# Altium footprint library tianxiaohua_PcbLib.PcbLib: 138 footprints (part 6 of 9)
Each footprint in its own frame and in the unit in brackets; x right, y up, seen from the top. Pads: shape width x height; smd on the part's side, far side on the other; paste and mask are expansions set on the pad; w line width, h text height; cw(c..) or ccw(c..) is an arc to the next point about the centre after c.
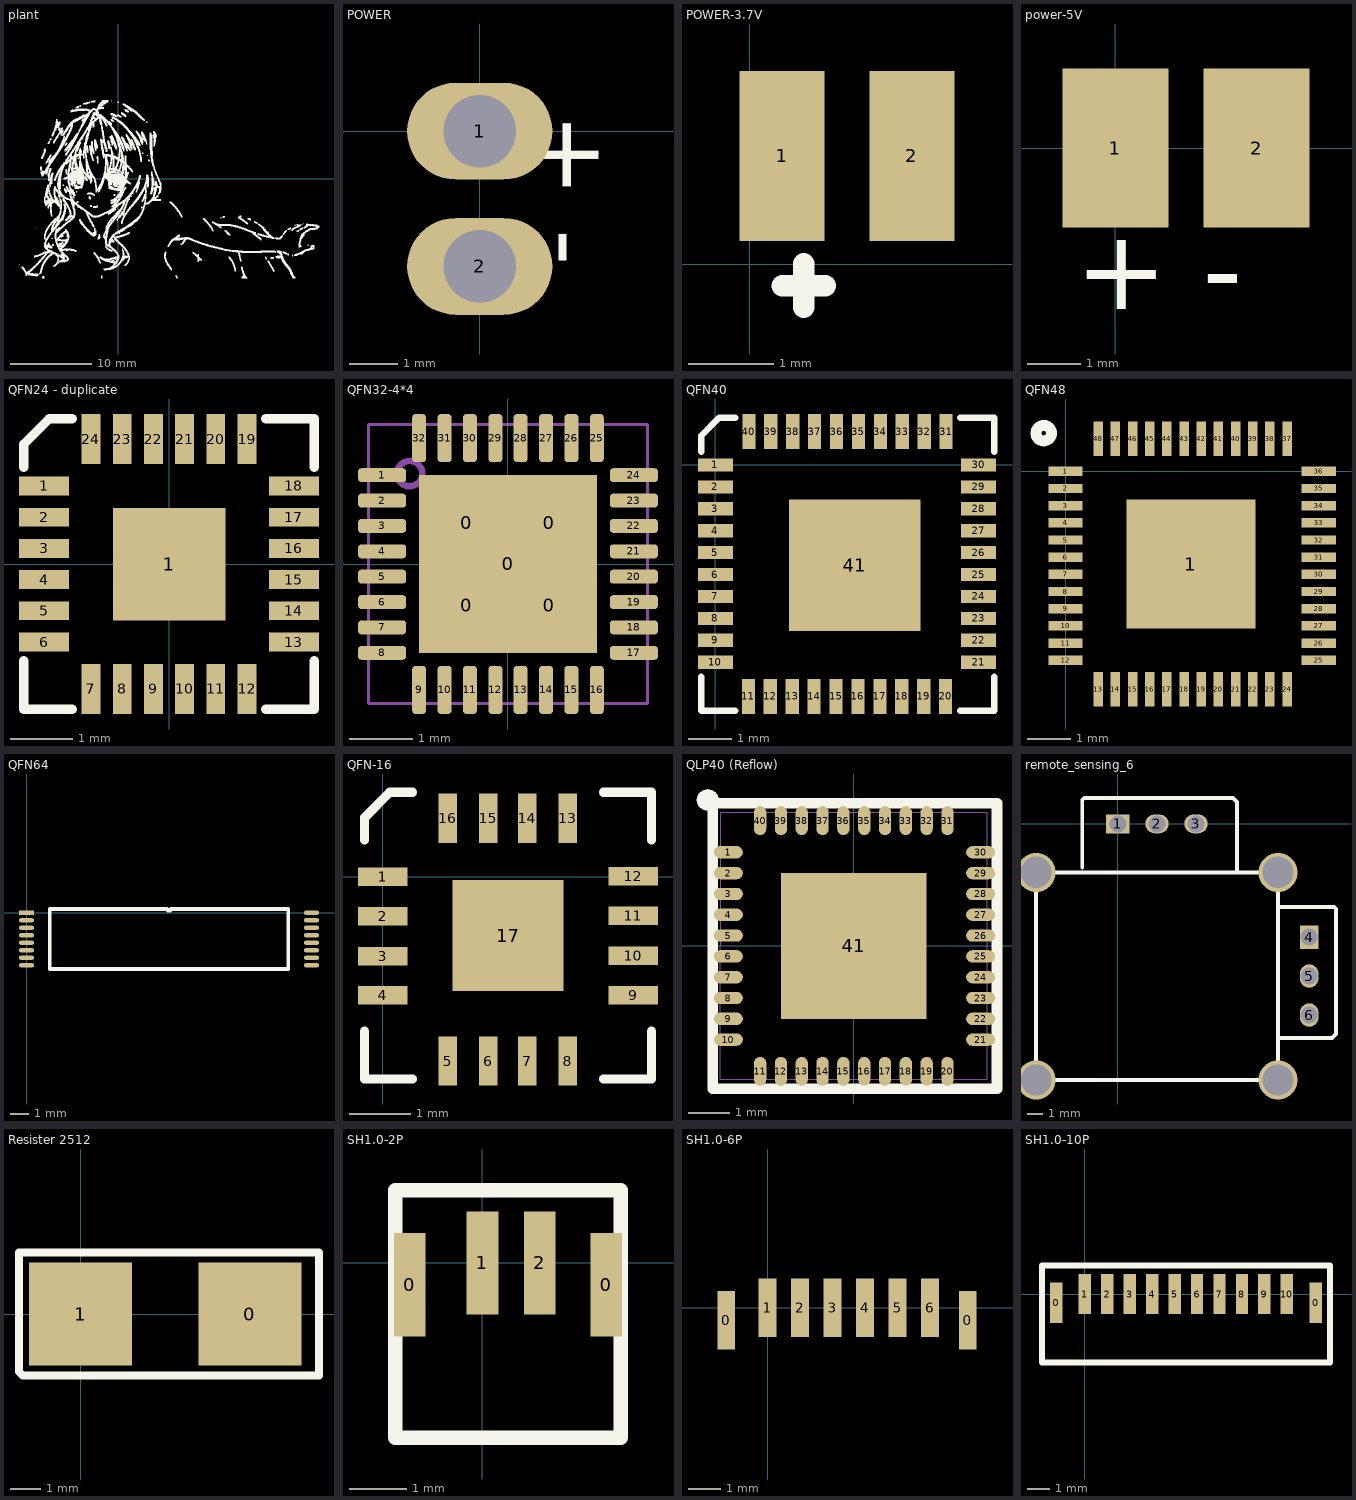
[diagram p5: the footprints below, top view; thin cyan lines are the x and y axes]

## plant [mm] "美少女"
Top Overlay:
  drawing of 12183 lines, arcs and shapes, not listed

## POWER [mm]
pads (2):
  oval 3x2 hole 1.5: 1(0,0) 2(0,-2.794)
Top Overlay:
  text "+ -" at 1.143,0.381 h1.52

## POWER-3.7V [mm]
pads (2):
  rect 1x2 smd: 1(0.381,1.27) 2(1.905,1.27)
Top Overlay:
  lines w0.254: 0.381,-0.254 0.889,-0.254 ; 0.635,-0.508 0.635,0

## power-5V [mm]
pads (2):
  rect 2x3 smd: 1(0,0) 2(2.667,0)
Top Overlay:
  text "+ -" at -0.762,-3.048 h1.52

## QFN24 - duplicate [mm]
pads (25):
  rect 0.8x0.3 smd: 1(-2,1.25) 2(-2,0.75) 3(-2,0.25) 4(-2,-0.25) 5(-2,-0.75) 6(-2,-1.25) 13(2,-1.25) 14(2,-0.75) 15(2,-0.25) 16(2,0.25) 17(2,0.75) 18(2,1.25)
  rect 1.8x1.8 smd: 1(0.005,0)
  rect 0.3x0.8 smd: 7(-1.25,-2) 8(-0.75,-2) 9(-0.25,-2) 10(0.25,-2) 11(0.75,-2) 12(1.25,-2) 19(1.25,2) 20(0.75,2) 21(0.25,2) 22(-0.25,2) 23(-0.75,2) 24(-1.25,2)
Top Overlay:
  lines w0.15: -2.325,-1.55 -2.325,-2.325 -1.55,-2.325 ; -2.325,1.55 -2.325,1.917 -1.917,2.325 -1.55,2.325 ; 1.55,-2.325 2.325,-2.325 2.325,-1.55 ; 1.55,2.325 2.325,2.325 2.325,1.55
3D body "QFN24.step": height 0.9, standoff 0, extent -1.997,-2.002 2.007,2.002

## QFN32-4*4 [mm]
pads (37):
  rrect50% 1.1x1.1 on Top Paste: 0(-0.65,-0.65) 0(-0.65,0.65) 0(0.65,-0.65) 0(0.65,0.65)
  rect 2.8x2.8 smd paste-10: 0(0,0)
  rrect50% 0.76x0.22 smd: 1(-1.985,1.4) 2(-1.985,1) 3(-1.985,0.6) 4(-1.985,0.2) 5(-1.985,-0.2) 6(-1.985,-0.6) 7(-1.985,-1) 8(-1.985,-1.4) 17(1.985,-1.4) 18(1.985,-1) 19(1.985,-0.6) 20(1.985,-0.2) 21(1.985,0.2) 22(1.985,0.6) 23(1.985,1) 24(1.985,1.4)
  rrect50% 0.22x0.76 smd: 9(-1.4,-1.985) 10(-1,-1.985) 11(-0.6,-1.985) 12(-0.2,-1.985) 13(0.2,-1.985) 14(0.6,-1.985) 15(1,-1.985) 16(1.4,-1.985) 25(1.4,1.985) 26(1,1.985) 27(0.6,1.985) 28(0.2,1.985) 29(-0.2,1.985) 30(-0.6,1.985) 31(-1,1.985) 32(-1.4,1.985)
Mechanical 11:
  circle w0.1: c-1.55,1.425 r0.2
Mechanical 15:
  lines w0.05: -0.5,0 0.5,0 ; 0,-0.5 0,0.5 ; -2.2,-2.2 2.2,-2.2 2.2,2.2 -2.2,2.2 -2.2,-2.2
3D body: height 0.55, standoff 0.05, extent -2,-2 2,2
3D body: height 0.56, standoff 0, extent -1.749,1.226 -1.35,1.625

## QFN40 [mm]
pads (41):
  rect 0.8x0.3 smd: 1(0,0) 2(0,-0.5) 3(0,-1) 4(0,-1.5) 5(0,-2) 6(0,-2.5) 7(0,-3) 8(0,-3.5) 9(0,-4) 10(0,-4.5) 21(6,-4.5) 22(6,-4) 23(6,-3.5) 24(6,-3) 25(6,-2.5) 26(6,-2) 27(6,-1.5) 28(6,-1) 29(6,-0.5) 30(6,0)
  rect 0.3x0.8 smd: 11(0.75,-5.282) 12(1.25,-5.282) 13(1.75,-5.282) 14(2.25,-5.282) 15(2.75,-5.282) 16(3.25,-5.282) 17(3.75,-5.282) 18(4.25,-5.282) 19(4.75,-5.282) 20(5.25,-5.282) 31(5.262,0.762) 32(4.762,0.762) 33(4.262,0.762) 34(3.762,0.762) 35(3.262,0.762) 36(2.762,0.762) 37(2.262,0.762) 38(1.762,0.762) 39(1.262,0.762) 40(0.762,0.762)
  rect 3x3 smd: 41(3.175,-2.286)
Top Overlay:
  lines w0.15: -0.325,-4.832 -0.325,-5.607 0.45,-5.607 ; -0.325,0.3 -0.325,0.667 0.083,1.075 0.45,1.075 ; 5.582,-5.607 6.357,-5.607 6.357,-4.832 ; 5.582,1.075 6.357,1.075 6.357,0.3
3D body "User Library-QFN40 (6x6).step": height 0.9, standoff 0, extent 0.048,-5.286 6.048,0.714

## QFN48 [mm]
pads (49):
  rect 0.8x0.22 smd: 1(0,0) 2(0,-0.4) 3(0,-0.8) 4(0,-1.2) 5(0,-1.6) 6(0,-2) 7(0,-2.4) 8(0,-2.8) 9(0,-3.2) 10(0,-3.6) 11(0,-4) 12(0,-4.4) 25(5.9,-4.4) 26(5.9,-4) 27(5.9,-3.6) 28(5.9,-3.2) 29(5.9,-2.8) 30(5.9,-2.4) 31(5.9,-2) 32(5.9,-1.6) 33(5.9,-1.2) 34(5.9,-0.8) 35(5.9,-0.4) 36(5.9,0)
  rect 3x3 smd: 1(2.921,-2.159)
  rect 0.22x0.8 smd: 13(0.762,-5.08) 14(1.162,-5.08) 15(1.562,-5.08) 16(1.962,-5.08) 17(2.362,-5.08) 18(2.762,-5.08) 19(3.162,-5.08) 20(3.562,-5.08) 21(3.962,-5.08) 22(4.362,-5.08) 23(4.762,-5.08) 24(5.162,-5.08) 37(5.162,0.762) 38(4.762,0.762) 39(4.362,0.762) 40(3.962,0.762) 41(3.562,0.762) 42(3.162,0.762) 43(2.762,0.762) 44(2.362,0.762) 45(1.962,0.762) 46(1.562,0.762) 47(1.162,0.762) 48(0.762,0.762)
Top Overlay:
  circle w0.254: c-0.508,0.889 r0.18
3D body "User Library-QFN48_0_4.step": height 0.9, standoff -0.01, extent -0.02,-5.159 5.98,0.841

## QFN64 [mm]
pads (16):
  rect 0.8x0.22 smd: 1(0,0)
  oval 0.8x0.22 smd: 2(0,-0.4) 3(0,-0.8) 4(0,-1.2) 5(0,-1.6) 6(0,-2) 7(0,-2.4) 8(0,-2.8) 9(15.2,-2.8) 10(15.2,-2.4) 11(15.2,-2) 12(15.2,-1.6) 13(15.2,-1.2) 14(15.2,-0.8) 15(15.2,-0.4) 16(15.2,0)
Top Overlay:
  lines w0.2: 1.235,-3 13.965,-3 13.965,0.2 7.7,0.2 cw(c7.6,0.2) 7.5,0.2 1.235,0.2 1.235,-3
3D body "User Library-QFN_64_8x8_EP4_2.step": height 0.81, standoff 0, extent 2.286,-6.159 10.286,1.841

## QFN-16 [mm]
pads (17):
  rect 0.8x0.3 smd: 1(0,0) 2(0,-0.638) 3(0,-1.288) 4(0,-1.923) 9(4.064,-1.926) 10(4.064,-1.281) 11(4.064,-0.636) 12(4.064,0.009)
  rect 0.3x0.8 smd: 5(1.053,-2.989) 6(1.708,-2.989) 7(2.343,-2.989) 8(2.998,-2.989) 13(2.998,0.948) 14(2.343,0.948) 15(1.708,0.948) 16(1.053,0.948)
  rect 1.8x1.8 smd: 17(2.032,-0.957)
Top Overlay:
  lines w0.15: -0.293,-2.507 -0.293,-3.282 0.482,-3.282 ; -0.293,0.593 -0.293,0.96 0.115,1.368 0.482,1.368 ; 3.582,-3.282 4.357,-3.282 4.357,-2.507 ; 3.582,1.368 4.357,1.368 4.357,0.593
3D body "User Library-QFN-16-1.step": height 0.85, standoff 0, extent -0.053,-3.042 4.117,1.128

## QLP40 (Reflow) [mm]
pads (41):
  oval 0.695x0.295 smd paste-0.045 mask+0.055: 1(-3.008,2.25) 2(-3.008,1.75) 3(-3.008,1.25) 4(-3.008,0.75) 5(-3.008,0.25) 6(-3.008,-0.25) 7(-3.008,-0.75) 8(-3.008,-1.25) 9(-3.008,-1.75) 10(-3.008,-2.25) 21(3.048,-2.25) 22(3.048,-1.75) 23(3.048,-1.25) 24(3.048,-0.75) 25(3.048,-0.25) 26(3.048,0.25) 27(3.048,0.75) 28(3.048,1.25) 29(3.048,1.75) 30(3.048,2.25)
  oval 0.295x0.695 smd paste-0.045 mask+0.055: 11(-2.248,-3.01) 12(-1.748,-3.01) 13(-1.248,-3.01) 14(-0.748,-3.01) 15(-0.248,-3.01) 16(0.252,-3.01) 17(0.752,-3.01) 18(1.252,-3.01) 19(1.752,-3.01) 20(2.252,-3.01) 31(2.252,3.01) 32(1.752,3.01) 33(1.252,3.01) 34(0.752,3.01) 35(0.252,3.01) 36(-0.248,3.01) 37(-0.748,3.01) 38(-1.248,3.01) 39(-1.748,3.01) 40(-2.248,3.01)
  rect 3.5x3.5 smd mask+0: 41(0,0)
Top Overlay:
  region: -3.505,3.247 -3.604,3.267 -3.688,3.323 -3.744,3.407 -3.764,3.506 -3.744,3.605 -3.688,3.689 -3.604,3.745 -3.505,3.765 -3.406,3.745 -3.322,3.689 -3.266,3.605 -3.246,3.506 -3.266,3.407 -3.322,3.323 -3.406,3.267
  lines w0.254: -3.388,-3.43 -3.388,3.43 3.442,3.43 3.442,-3.43 -3.388,-3.43
Mechanical 1:
  region: -3.505,3.247 -3.604,3.267 -3.688,3.323 -3.744,3.407 -3.764,3.506 -3.744,3.605 -3.688,3.689 -3.604,3.745 -3.505,3.765 -3.406,3.745 -3.322,3.689 -3.266,3.605 -3.246,3.506 -3.266,3.407 -3.322,3.323 -3.406,3.267
  lines w0.025: -3.208,-3.2 -3.199,3.21 3.202,3.21 3.202,-3.2 -3.208,-3.2
Mechanical 2:
  lines w0.003: -3.388,-3.4 -3.388,3.4 3.442,3.4 3.442,-3.4 -3.388,-3.4
3D body "User Library-QFN40 (6x6).step": height 0.9, standoff 0, extent -2.952,-3 3.048,3

## remote_sensing_6 [mm]
pads (6):
  rect 1.5x1.2 hole 1.1: 1(0,0)
  oval 1.5x1.2 hole 1.1: 2(2.5,0) 3(5,0)
  rect 1.2x1.5 hole 1.1: 4(12.25,-7.25)
  oval 1.2x1.5 hole 1.1: 5(12.25,-9.75) 6(12.25,-12.25)
via -5.25,-3.1 diameter 2.5 hole 2
via 10.25,-3.1 diameter 2.5 hole 2
via -5.25,-16.4 diameter 2.5 hole 2
via 10.25,-16.4 diameter 2.5 hole 2
Top Overlay:
  lines w0.254: -2.286,-2.794 -2.286,1.524 -2.159,1.651 7.366,1.651 7.62,1.397 7.62,-3.048 ; 10.414,-13.716 13.716,-13.716 13.97,-13.462 13.97,-5.461 13.843,-5.334 10.414,-5.334 ; -5.25,-16.4 10.25,-16.4 10.25,-3.1 -5.25,-3.1 -5.25,-16.4
3D body: height 10, standoff 0, extent -5.25,-16.4 10.25,-3.1
3D body: height 5, standoff 0, extent -2.413,-3.175 7.62,1.397
3D body: height 5, standoff 0, extent 10.287,-13.716 13.97,-5.334
3D body: height 16, standoff 0, extent 0.286,-11.396 4.286,-7.4
3D body: height 19, standoff 13, extent -0.711,-12.397 5.286,-6.399

## Resister 2512 [mm]
pads (2):
  rect 3.4x3.4 smd: 0(5.588,0) 1(0,0)
Top Overlay:
  lines w0.254: -2.032,-1.905 -2.032,-1.397 -2.032,2.032 7.874,2.032 7.874,-1.905 7.874,-2.032 -1.905,-2.032 -2.032,-1.905

## SH1.0-2P [mm]
pads (4):
  rect 0.55x1.8 smd: 0(-1.27,-0.381) 0(2.159,-0.381) 1(0,0) 2(1,0)
Top Overlay:
  lines w0.254: -1.524,-3.048 2.413,-3.048 2.413,1.27 -1.524,1.27 -1.524,-3.048
3D body: height 3, standoff 0, extent -1.524,-3.175 2.413,0

## SH1.0-6P [mm]
pads (8):
  rect 0.55x1.8 smd: 0(-1.27,-0.381) 0(6.159,-0.381) 1(0,0) 2(1,0) 3(2,0) 4(3,0) 5(4,0) 6(5,0)
3D body: height 3, standoff 0, extent -1.524,-3.175 6.477,0

## SH1.0-10P [mm]
pads (12):
  rect 0.55x1.8 smd: 0(-1.27,-0.381) 0(10.287,-0.381) 1(0,0) 2(1,0) 3(2,0) 4(3,0) 5(4,0) 6(5,0) 7(6,0) 8(7,0) 9(8,0) 10(9,0)
Top Overlay:
  lines w0.254: -1.905,-3.048 10.922,-3.048 10.922,1.27 -1.905,1.27 -1.905,-3.048
3D body: height 3, standoff 0, extent -1.524,-3.175 10.795,0